# Altium footprint library SCT8-Board.PcbLib: 132 footprints (part 5 of 9)
Each footprint in its own frame and in the unit in brackets; x right, y up, seen from the top. Pads: shape width x height; smd on the part's side, far side on the other; paste and mask are expansions set on the pad; w line width, h text height; cw(c..) or ccw(c..) is an arc to the next point about the centre after c.
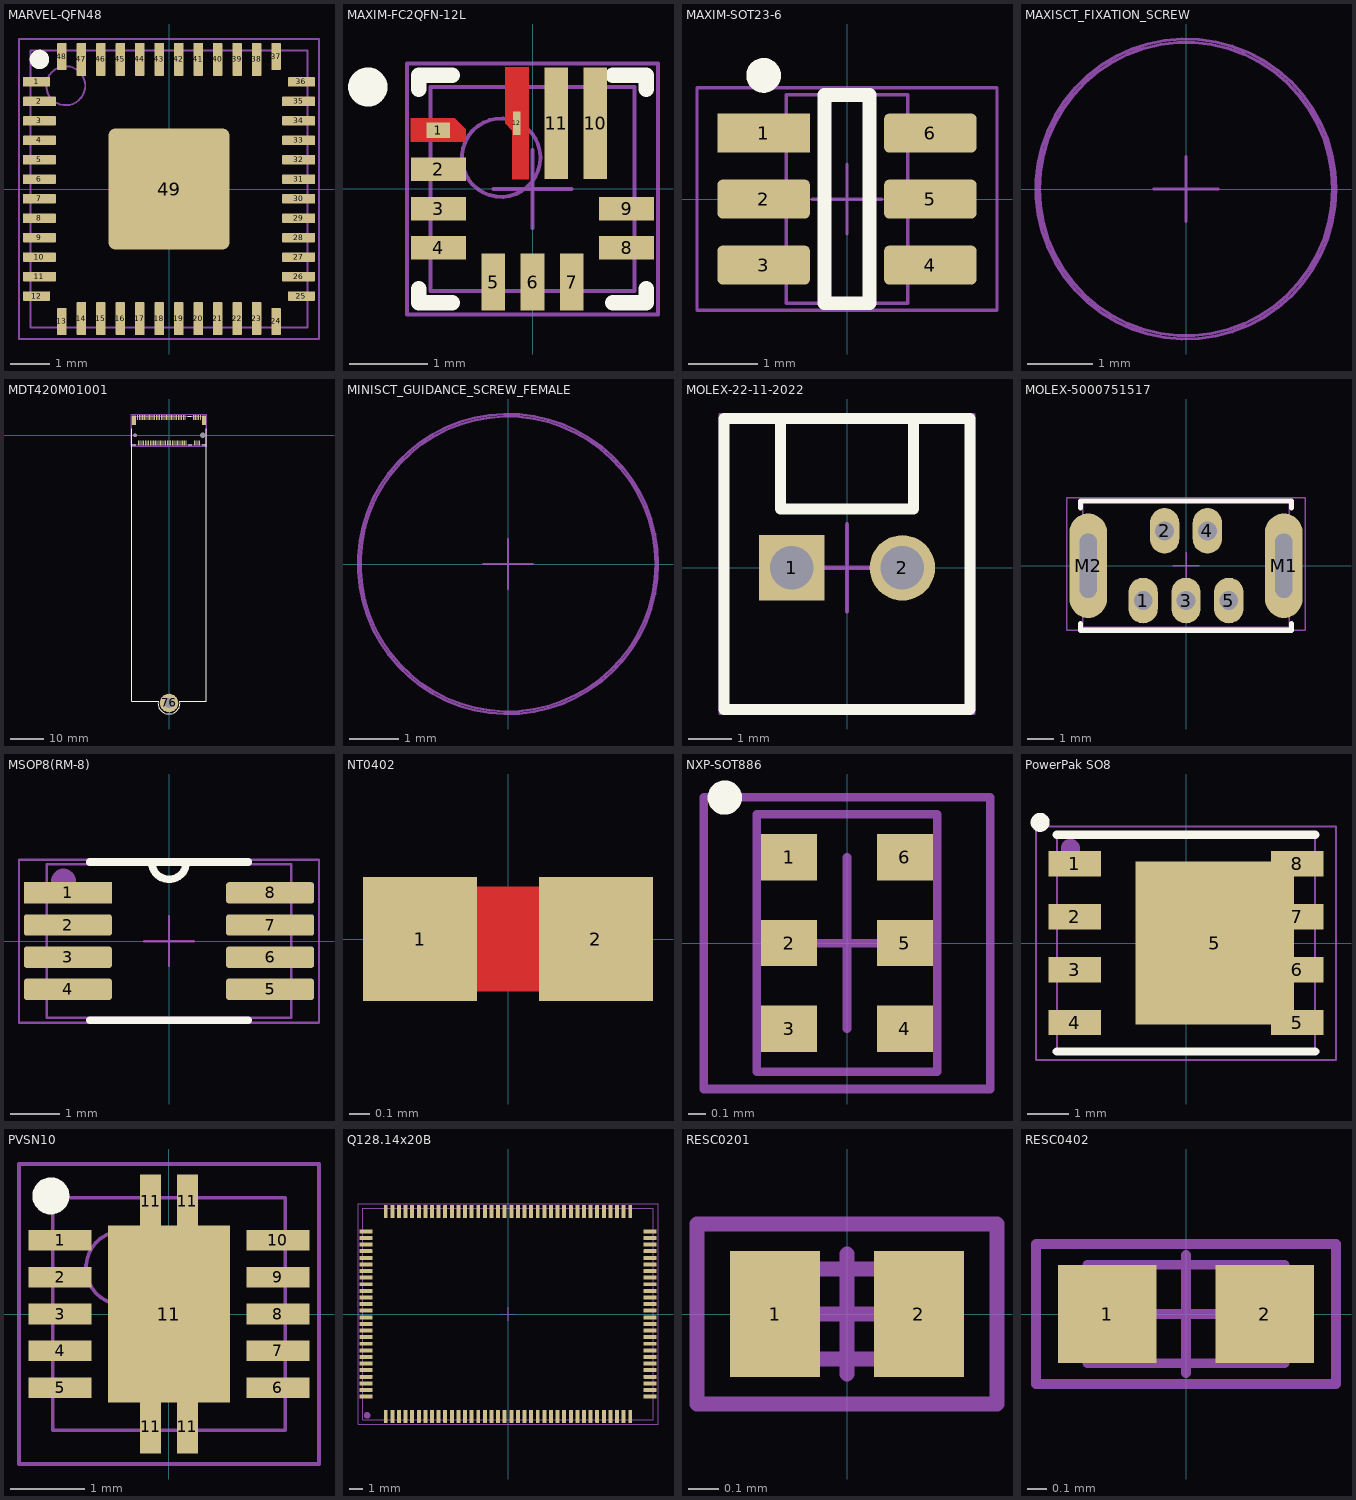
[diagram p4: the footprints below, top view; thin cyan lines are the x and y axes]

## MARVEL-QFN48 [mm] "QFN, 48-Leads, Body 7.00x7.00mm, Pitch 0.50mm, Thermal Pad 3.10x3.10mm, IPC High Density"
height 1
pads (49):
  rect 0.7x0.25 smd: 1(-3.4,2.75)
  rrect25% 0.85x0.25 smd: 2(-3.325,2.25) 3(-3.325,1.75) 4(-3.325,1.25) 5(-3.325,0.75) 6(-3.325,0.25) 7(-3.325,-0.25) 8(-3.325,-0.75) 9(-3.325,-1.25) 10(-3.325,-1.75) 11(-3.325,-2.25) 26(3.325,-2.25) 27(3.325,-1.75) 28(3.325,-1.25) 29(3.325,-0.75) 30(3.325,-0.25) 31(3.325,0.25) 32(3.325,0.75) 33(3.325,1.25) 34(3.325,1.75) 35(3.325,2.25)
  rrect25% 0.7x0.25 smd: 12(-3.4,-2.75) 25(3.4,-2.75) 36(3.4,2.75)
  rrect25% 0.25x0.7 smd: 13(-2.75,-3.4) 24(2.75,-3.4) 37(2.75,3.4) 48(-2.75,3.4)
  rrect25% 0.25x0.85 smd: 14(-2.25,-3.325) 15(-1.75,-3.325) 16(-1.25,-3.325) 17(-0.75,-3.325) 18(-0.25,-3.325) 19(0.25,-3.325) 20(0.75,-3.325) 21(1.25,-3.325) 22(1.75,-3.325) 23(2.25,-3.325) 38(2.25,3.325) 39(1.75,3.325) 40(1.25,3.325) 41(0.75,3.325) 42(0.25,3.325) 43(-0.25,3.325) 44(-0.75,3.325) 45(-1.25,3.325) 46(-1.75,3.325) 47(-2.25,3.325)
  rrect10% 3.1x3.1 smd: 49(0,0)
Top Overlay:
  circle w0.25: c-3.325,3.325 r0.125
Top Courtyard:
  lines w0.05: -3.85,-3.85 -3.85,3.85 3.85,3.85 3.85,-3.85 -3.85,-3.85
Top Designator:
  text ".Designator" at -1.912,-0.192 h0.85
Top Component Center:
  lines w0.05: -0.5,0 0.5,0 ; 0,-0.5 0,0.5
Top Component Outline:
  circle w0.05: c-2.65,2.65 r0.5
  lines w0.05: -3.55,-3.55 3.55,-3.55 3.55,3.55 -3.55,3.55 -3.55,-3.55
3D body: height 1, standoff 0, extent -3.55,-3.55 3.55,3.55

## MAXIM-FC2QFN-12L [mm] "QFN, 14-Leads, Body 2.50x2.50mm, Pitch 0.50mm, IPC High Density"
height 0.6
pads (12):
  rect 0.3x0.2 smd: 1(-1.2,0.75)
  rect 0.7x0.3 smd: 2(-1.2,0.25) 3(-1.2,-0.25) 4(-1.2,-0.75) 8(1.2,-0.75) 9(1.2,-0.25)
  rect 0.3x0.725 smd: 5(-0.5,-1.188) 6(0,-1.188) 7(0.5,-1.188)
  rect 0.3x1.425 smd: 10(0.8,0.837) 11(0.3,0.837)
  rect 0.1x0.3 smd: 12(-0.2,0.837)
Top Layer:
  region: -1.55,0.9 -1.55,0.6 -0.85,0.6 -0.85,0.76 -0.99,0.9
  region: -0.05,0.125 -0.05,1.55 -0.35,1.55 -0.35,0.84 -0.26,0.741 -0.26,0.125
Top Overlay:
  circle w0.25: c-2.1,1.3 r0.125
  lines w0.2: -1.45,-1.275 -1.45,-1.45 -1.025,-1.45 ; -1.45,1.275 -1.45,1.45 -1.025,1.45 ; 1.025,-1.45 1.45,-1.45 1.45,-1.275 ; 1.025,1.45 1.45,1.45 1.45,1.275
Top Courtyard:
  lines w0.05: -1.6,-1.6 1.6,-1.6 1.6,1.6 -1.6,1.6 -1.6,-1.6
Top Designator:
  text ".Designator" at -1.126,-0.113 h0.5
Top Component Center:
  lines w0.05: -0.5,0 0.5,0 ; 0,-0.5 0,0.5
Top Component Outline:
  circle w0.05: c-0.4,0.4 r0.5
  lines w0.05: -1.3,-1.3 1.3,-1.3 1.3,1.3 -1.3,1.3 -1.3,-1.3
3D body: height 0.6, standoff 0, extent -1.3,-1.3 1.3,1.3

## MAXIM-SOT23-6 [mm] "SOT23, 6-Leads, Body 2.90x2.80mm, Pitch 0.95mm, IPC High Density"
height 1.45
pads (6):
  rect 1.33x0.56 smd: 1(-1.2,0.95)
  rrect25% 1.33x0.56 smd: 2(-1.2,0) 3(-1.2,-0.95) 4(1.2,-0.95) 5(1.2,0) 6(1.2,0.95)
Top Overlay:
  circle w0.25: c-1.2,1.78 r0.125
  lines w0.2: -0.325,-1.5 0.325,-1.5 0.325,1.5 -0.325,1.5 -0.325,-1.5
Top Courtyard:
  lines w0.05: -2.159,-1.6 -2.159,1.6 2.159,1.6 2.159,-1.6 -2.159,-1.6
Top Designator:
  text ".Designator" at 0.135,-1.349 h0.6
Top Component Center:
  lines w0.05: -0.5,0 0.5,0 ; 0,-0.5 0,0.5
Top Component Outline:
  lines w0.05: -0.875,-1.5 0.875,-1.5 0.875,1.5 -0.875,1.5 -0.875,-1.5
3D body: height 1.45, standoff 0, extent -0.875,-1.5 0.875,1.5

## MAXISCT_FIXATION_SCREW [mm]
Top Courtyard:
  circle w0.05: c0,0 r2.3
Top Designator:
  text ".Designator" at -2.252,-0.226 h1
Top Component Center:
  lines w0.05: -0.5,0 0.5,0 ; 0,-0.5 0,0.5
Top Component Outline:
  circle w0.05: c0,0 r2.25
3D body "ISO1207 M2.5x10.STEP": height 1.8, standoff -10, extent -2.25,-2.25 2.25,2.25

## MDT420M01001 [mm] "M.2 (M-Key) Amphenol"
pads (72):
  rect 1.2x2.75 smd paste+0 mask+0.05: 0(-10.35,4.5) 0(10.35,4.5)
  round 1 hole 1.1 unplated paste+0 mask+0.05: 0(-10,0)
  round 1 hole 1.6 unplated paste+0 mask+0.05: 0(10,0)
  rect 0.3x1.55 smd paste+0 mask+0.05: 1(-9.25,5.275) 2(-9,-2.275) 3(-8.75,5.275) 4(-8.5,-2.275) 5(-8.25,5.275) 6(-8,-2.275) 7(-7.75,5.275) 8(-7.5,-2.275) 9(-7.25,5.275) 10(-7,-2.275) 11(-6.75,5.275) 12(-6.5,-2.275) 13(-6.25,5.275) 14(-6,-2.275) 15(-5.75,5.275) 16(-5.5,-2.275) 17(-5.25,5.275) 18(-5,-2.275) 19(-4.75,5.275) 20(-4.5,-2.275) 21(-4.25,5.275) 22(-4,-2.275) 23(-3.75,5.275) 24(-3.5,-2.275) 25(-3.25,5.275) 26(-3,-2.275) 27(-2.75,5.275) 28(-2.5,-2.275) 29(-2.25,5.275) 30(-2,-2.275) 31(-1.75,5.275) 32(-1.5,-2.275) 33(-1.25,5.275) 34(-1,-2.275) 35(-0.75,5.275) 36(-0.5,-2.275) 37(-0.25,5.275) 38(0,-2.275) 39(0.25,5.275) 40(0.5,-2.275) 41(0.75,5.275) 42(1,-2.275) 43(1.25,5.275) 44(1.5,-2.275) 45(1.75,5.275) 46(2,-2.275) 47(2.25,5.275) 48(2.5,-2.275) 49(2.75,5.275) 50(3,-2.275) 51(3.25,5.275) 52(3.5,-2.275) 53(3.75,5.275) 54(4,-2.275) 55(4.25,5.275) 56(4.5,-2.275) 57(4.75,5.275) 58(5,-2.275) 67(7.25,5.275) 68(7.5,-2.275) 69(7.75,5.275) 70(8,-2.275) 71(8.25,5.275) 72(8.5,-2.275) 73(8.75,5.275) 74(9,-2.275) 75(9.25,5.275)
  round 5.5 hole 3 paste-2: 76(0,-79)
Top Overlay:
  lines w0.254: -11,-2.85 -9.75,-2.85 ; -11,2 -11,-78.51 ; 3.214,-78.516 cw(c0,-79) -3.213,-78.51 -11,-78.51 ; 3.214,-78.51 11,-78.51 11,2 ; 5.5,5.7 6.5,5.7 ; 5.75,-2.85 6.75,-2.85 ; 9.75,-2.85 11,-2.85 ; -11,-78.51 -11,-78.51
Top Courtyard:
  lines w0.05: -11.2,-3.2 11.2,-3.2 11.2,6.2 11.2,6.3 -11.2,6.3 -11.2,-3.2
Top Designator:
  text ".Designator" at -1.912,-0.192 h0.85
Top 3D Body:
  lines w0.05: -11,-2.85 -11,5.7 11,5.7 11,-2.85 -11,-2.85
3D body "NVMe.STEP": height 4.76, standoff 0.96, extent -11,-78.51 11,1.5
3D body "SupportScrews.STEP": height 5.32, standoff -3.4, extent -3.175,-81.75 3.176,-76.25
3D body "MDT420M01001.STEP": height 4.2, standoff -0.6, extent -11,-2.85 11,5.7

## MINISCT_GUIDANCE_SCREW_FEMALE [mm]
Top Courtyard:
  circle w0.05: c0,0 r3.05
Top Designator:
  text ".Designator" at -2.252,-0.226 h1
Top Component Center:
  lines w0.05: -0.5,0 0.5,0 ; 0,-0.5 0,0.5
Top Component Outline:
  circle w0.05: c0,0 r3
3D body "GuidanceScrewFemale.STEP": height 19.6, standoff -5.4, extent -2.886,-2.541 2.886,2.541

## MOLEX-22-11-2022 [mm]
height 1.6
pads (2):
  rect 1.5x1.5 hole 1: 1(-1.27,0)
  round 1.5 hole 1: 2(1.27,0)
Top Overlay:
  lines w0.254: -1.524,3.429 -1.524,1.347 0,1.347 1.524,1.347 1.524,3.429 ; -2.819,-3.251 -2.819,3.429 2.82,3.429 2.82,-3.251 -2.819,-3.251
Top Courtyard:
  lines w0.05: -2.919,-3.351 2.919,-3.351 2.919,3.529 -2.919,3.529 -2.919,-3.351
Top Designator:
  text ".Designator" at -1.912,-0.192 h0.85
Top Component Center:
  lines w0.1: -1,0 1,0 ; 0,-1 0,1
Top Component Outline:
  lines w0.05: -2.819,-3.251 2.82,-3.251 2.82,3.429 -2.819,3.429 -2.819,-3.251
3D body "0022112022.STEP": height 15.88, standoff -3.56, extent -2.819,-3.251 2.819,3.429

## MOLEX-5000751517 [mm]
pads (7):
  oval 1.1x1.7 hole 0.7: 1(-1.6,-1.3) 2(-0.8,1.3) 3(0,-1.3) 4(0.8,1.3) 5(1.6,-1.3)
  oval 1.4x3.9 hole 0.65 slot 2.4 at 90 deg: M1(3.65,0) M2(-3.65,0)
Top Overlay:
  lines w0.2: -3.937,-2.159 -3.937,-2.413 3.937,-2.413 3.937,-2.159 ; -3.937,2.159 -3.937,2.413 3.937,2.413 3.937,2.159
Top Courtyard:
  lines w0.05: -4.445,-2.413 4.445,-2.413 4.445,2.54 -4.445,2.54 -4.445,-2.413
Top Designator:
  text ".Designator" at -1.912,-0.192 h0.85
Top Component Center:
  lines w0.05: -0.5,0 0.5,0 ; 0,-0.5 0,0.5
Top Component Outline:
  lines w0.05: -3.85,-2.3 3.85,-2.3 3.85,2.4 -3.85,2.4 -3.85,-2.3
3D body "5000751517.STEP": height 7.75, standoff -2.05, extent -3.85,-2.3 3.85,2.4

## MSOP8(RM-8) [mil] "8-Lead MSOP"
pads (8):
  rect 70x17 smd paste+0 mask+1.97: 1(-80.5,38.39)
  rrect25% 70x17 smd paste+0 mask+1.97: 2(-80.5,12.8) 3(-80.5,-12.8) 4(-80.5,-38.39) 5(80.5,-38.39) 6(80.5,-12.8) 7(80.5,12.8) 8(80.5,38.39)
Top Overlay:
  lines w5.98: -13.57,60.6 ccw(c0,62.99) 13.78,62.99
  lines w6: -63,-63 63,-63 ; -63,63 63,63
Top Courtyard:
  lines w1.97: -119.44,-64.96 119.44,-64.96 119.44,64.96 -119.44,64.96 -119.44,-64.96
Top Designator:
  text ".Designator" at -75.27,-7.55 h33.46
Top Component Center:
  lines w1.97: -19.68,0 19.68,0 ; 0,-19.68 0,19.68
Top Component Outline:
  circle w11.81: c-84.01,47.83 r3.94
  lines w1.97: -97.19,-61.02 -97.19,61.03 97.2,61.03 97.2,-61.02 -97.19,-61.02
3D body "MSOP8(RM-8).step": height 43.31, standoff 0, extent -97.19,-61.02 97.2,61.03

## NT0402 [mm] "20 mil"
pads (2):
  rect 0.55x0.6 smd paste-1: 1(-0.425,0) 2(0.425,0)
Top Layer:
  lines w0.508: -0.425,0 0.425,0
Top Component Center:
  lines w0.05: -0.2,0 0.2,0 ; 0,-0.2 0,0.2

## NXP-SOT886 [mm] "SON, 6-Leads, Body 1.45x1.00mm, Pitch 0.50mm, IPC High Density"
height 0.5
pads (6):
  rect 0.325x0.27 smd: 1(-0.337,0.5) 2(-0.337,0) 3(-0.337,-0.5) 4(0.337,-0.5) 5(0.337,0) 6(0.337,0.5)
Top Overlay:
  circle w0.1: c-0.712,0.847 r0.05
Top Courtyard:
  lines w0.05: -0.835,-0.85 0.835,-0.85 0.835,0.85 -0.835,0.85 -0.835,-0.85
Top Designator:
  text ".Designator" at 0.068,-0.674 h0.3
Top Component Center:
  lines w0.05: -0.5,0 0.5,0 ; 0,-0.5 0,0.5
Top Component Outline:
  lines w0.05: -0.525,-0.75 -0.525,0.75 0.525,0.75 0.525,-0.75 -0.525,-0.75
3D body: height 0.5, standoff 0.04, extent -0.525,-0.75 0.525,0.75

## PowerPak SO8 [mm]
pads (9):
  rect 1.27x0.61 smd: 1(-2.67,1.905) 2(-2.67,0.635) 3(-2.67,-0.635) 4(-2.67,-1.905) 5(2.67,-1.905) 6(2.67,-0.635) 7(2.67,0.635) 8(2.67,1.905)
  rect 3.81x3.91 smd: 5(0.69,0)
Top Overlay:
  circle w0.254: c-3.5,2.9 r0.1
  lines w0.2: -3.1,-2.6 3.1,-2.6 ; -3.1,2.6 3.1,2.6
Top Courtyard:
  lines w0.05: -3.6,-2.8 -3.6,2.8 3.6,2.8 3.6,-2.8 -3.6,-2.8
Top Designator:
  text ".Designator" at -1.912,-0.192 h0.85
Top Component Center:
  lines w0.05: -1,0 1,0 ; 0,-1 0,1
Top Component Outline:
  circle w0.254: c-2.775,2.275 r0.1
  lines w0.05: -3.1,-2.6 3.1,-2.6 3.1,2.6 -3.1,2.6 -3.1,-2.6
3D body: height 1.12, standoff 0, extent -3.1,-2.6 3.1,2.6

## PVSN10 [mm]
height 1
pads (15):
  rect 0.85x0.28 smd paste+0 mask+0.05: 1(-1.475,1) 2(-1.475,0.5) 3(-1.475,0) 4(-1.475,-0.5) 5(-1.475,-1) 6(1.475,-1) 7(1.475,-0.5) 8(1.475,0) 9(1.475,0.5) 10(1.475,1)
  rect 0.28x0.72 smd paste+0 mask+0.05: 11(-0.25,-1.53) 11(-0.25,1.53) 11(0.25,-1.53) 11(0.25,1.53)
  rect 1.65x2.4 smd paste+0 mask+0.05: 11(0,0)
Top Overlay:
  circle w0.25: c-1.6,1.6 r0.125
Top Courtyard:
  lines w0.05: -2.032,-2.032 -2.032,2.032 2.032,2.032 2.032,-2.032 -2.032,-2.032
Top Designator:
  text ".Designator" at -1.46,-0.147 h0.65
Top Component Center:
  lines w0.06: -0.5,0 0.5,0 ; 0,-0.5 0,0.5
Top Component Outline:
  circle w0.05: c-0.625,0.625 r0.5
  lines w0.05: -1.575,-1.575 1.575,-1.575 1.575,1.575 -1.575,1.575 -1.575,-1.575
3D body: height 1, standoff 0, extent -1.575,-1.575 1.575,1.575

## Q128.14x20B [mm]
pads (128):
  rect 0.3x1 smd paste+0 mask+0.05: 1(-9.25,-7.75)
  rrect25% 0.3x1 smd paste+0 mask+0.05: 2(-8.75,-7.75) 3(-8.25,-7.75) 4(-7.75,-7.75) 5(-7.25,-7.75) 6(-6.75,-7.75) 7(-6.25,-7.75) 8(-5.75,-7.75) 9(-5.25,-7.75) 10(-4.75,-7.75) 11(-4.25,-7.75) 12(-3.75,-7.75) 13(-3.25,-7.75) 14(-2.75,-7.75) 15(-2.25,-7.75) 16(-1.75,-7.75) 17(-1.25,-7.75) 18(-0.75,-7.75) 19(-0.25,-7.75) 20(0.25,-7.75) 21(0.75,-7.75) 22(1.25,-7.75) 23(1.75,-7.75) 24(2.25,-7.75) 25(2.75,-7.75) 26(3.25,-7.75) 27(3.75,-7.75) 28(4.25,-7.75) 29(4.75,-7.75) 30(5.25,-7.75) 31(5.75,-7.75) 32(6.25,-7.75) 33(6.75,-7.75) 34(7.25,-7.75) 35(7.75,-7.75) 36(8.25,-7.75) 37(8.75,-7.75) 38(9.25,-7.75) 65(9.25,7.75) 66(8.75,7.75) 67(8.25,7.75) 68(7.75,7.75) 69(7.25,7.75) 70(6.75,7.75) 71(6.25,7.75) 72(5.75,7.75) 73(5.25,7.75) 74(4.75,7.75) 75(4.25,7.75) 76(3.75,7.75) 77(3.25,7.75) 78(2.75,7.75) 79(2.25,7.75) 80(1.75,7.75) 81(1.25,7.75) 82(0.75,7.75) 83(0.25,7.75) 84(-0.25,7.75) 85(-0.75,7.75) 86(-1.25,7.75) 87(-1.75,7.75) 88(-2.25,7.75) 89(-2.75,7.75) 90(-3.25,7.75) 91(-3.75,7.75) 92(-4.25,7.75) 93(-4.75,7.75) 94(-5.25,7.75) 95(-5.75,7.75) 96(-6.25,7.75) 97(-6.75,7.75) 98(-7.25,7.75) 99(-7.75,7.75) 100(-8.25,7.75) 101(-8.75,7.75) 102(-9.25,7.75)
  rrect25% 1x0.3 smd paste+0 mask+0.05: 39(10.75,-6.25) 40(10.75,-5.75) 41(10.75,-5.25) 42(10.75,-4.75) 43(10.75,-4.25) 44(10.75,-3.75) 45(10.75,-3.25) 46(10.75,-2.75) 47(10.75,-2.25) 48(10.75,-1.75) 49(10.75,-1.25) 50(10.75,-0.75) 51(10.75,-0.25) 52(10.75,0.25) 53(10.75,0.75) 54(10.75,1.25) 55(10.75,1.75) 56(10.75,2.25) 57(10.75,2.75) 58(10.75,3.25) 59(10.75,3.75) 60(10.75,4.25) 61(10.75,4.75) 62(10.75,5.25) 63(10.75,5.75) 64(10.75,6.25) 103(-10.75,6.25) 104(-10.75,5.75) 105(-10.75,5.25) 106(-10.75,4.75) 107(-10.75,4.25) 108(-10.75,3.75) 109(-10.75,3.25) 110(-10.75,2.75) 111(-10.75,2.25) 112(-10.75,1.75) 113(-10.75,1.25) 114(-10.75,0.75) 115(-10.75,0.25) 116(-10.75,-0.25) 117(-10.75,-0.75) 118(-10.75,-1.25) 119(-10.75,-1.75) 120(-10.75,-2.25) 121(-10.75,-2.75) 122(-10.75,-3.25) 123(-10.75,-3.75) 124(-10.75,-4.25) 125(-10.75,-4.75) 126(-10.75,-5.25) 127(-10.75,-5.75) 128(-10.75,-6.25)
Top Overlay:
  text "." at -10.5,-7.3 h1
Top Courtyard:
  lines w0.05: -11.35,-8.35 -11.35,8.35 11.35,8.35 11.35,-8.35 -11.35,-8.35
Top Designator:
  text ".Designator" at -1.912,-0.192 h0.85
Top Component Center:
  lines w0.06: -0.5,0 0.5,0 ; 0,-0.5 0,0.5
Top Component Outline:
  circle w0.3: c-10.665,-7.665 r0.1
  lines w0.05: -11,-8 11,-8 11,8 -11,8 -11,-8
3D body "Q128.14x20B.STEP": height 1.64, standoff 0, extent -11,-8 11,8

## RESC0201 [mm] "Chip Resistor, Body 0.6x0.3mm (LxW typ) [0201], IPC High Density"
height 0.26
pads (2):
  rect 0.3x0.42 smd paste+0 mask+0.05: 1(-0.24,0) 2(0.24,0)
Top Solder:
  rectangle: -0.041,-0.26 0.041,0.26
Top Courtyard:
  lines w0.05: -0.5,-0.3 -0.5,0.3 0.5,0.3 0.5,-0.3 -0.5,-0.3
Top Designator:
  text ".Designator" at -0.451,-0.045 h0.2
Top Component Center:
  lines w0.05: -0.2,0 0.2,0 ; 0,-0.2 0,0.2
Top Component Outline:
  lines w0.05: -0.3,-0.15 -0.3,0.15 0.3,0.15 0.3,-0.15 -0.3,-0.15
3D body "R0201.STEP": height 0.23, standoff 0, extent -0.3,-0.15 0.3,0.15

## RESC0402 [mm] "Chip Resistor, Body 1.1x0.5mm (LxW typ) [0402], IPC High Density"
height 0.4
pads (2):
  rect 0.5x0.5 smd: 1(-0.4,0) 2(0.4,0)
Top Courtyard:
  lines w0.05: -0.762,-0.356 0.762,-0.356 0.762,0.356 -0.762,0.356 -0.762,-0.356
Top Designator:
  text ".Designator" at -0.564,-0.057 h0.25
Top Component Center:
  lines w0.05: -0.3,0 0.3,0 ; 0,-0.3 0,0.3
Top Component Outline:
  lines w0.05: -0.5,-0.25 0.5,-0.25 0.5,0.25 -0.5,0.25 -0.5,-0.25
3D body "R0402.STEP": height 0.35, standoff 0, extent -0.5,-0.25 0.5,0.25